# Altium footprint library HW_Dron_V2.PcbLib: 55 footprints (part 1 of 4)
Each footprint in its own frame and in the unit in brackets; x right, y up, seen from the top. Pads: shape width x height; smd on the part's side, far side on the other; paste and mask are expansions set on the pad; w line width, h text height; cw(c..) or ccw(c..) is an arc to the next point about the centre after c.
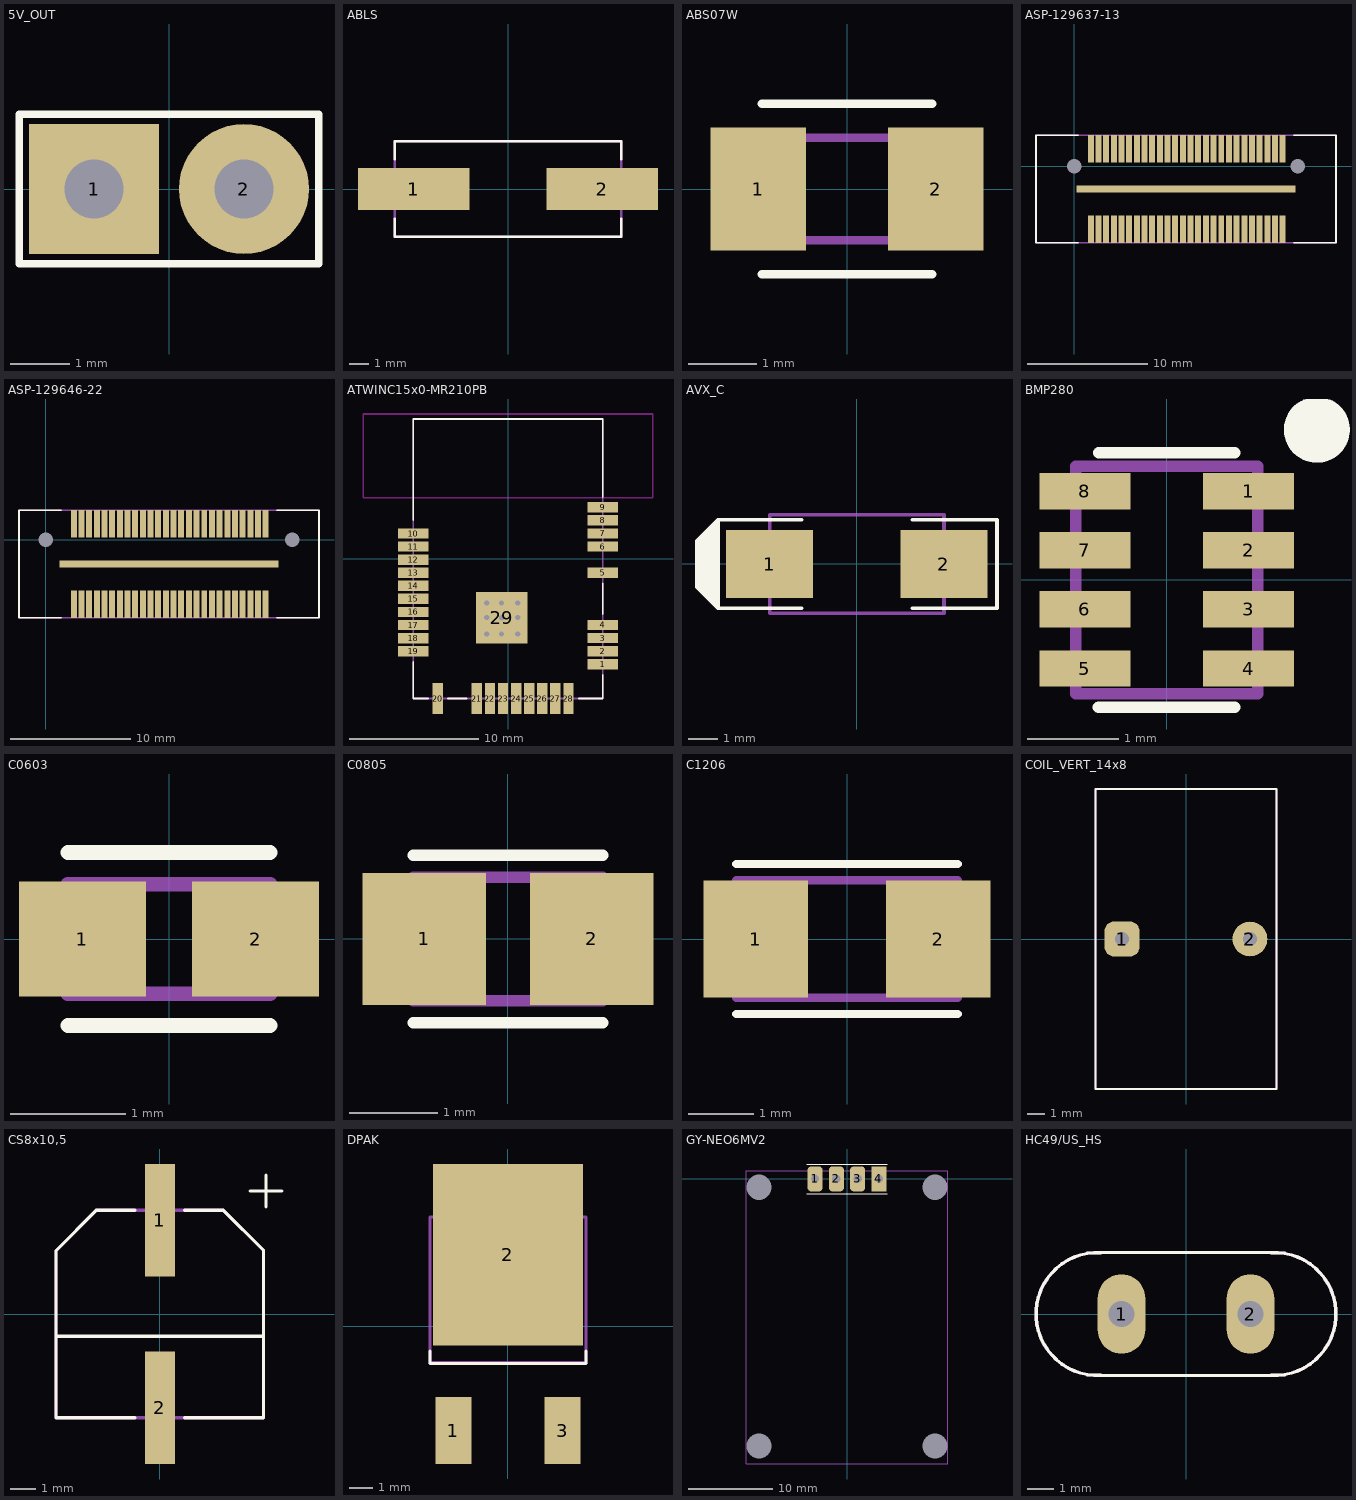
[diagram p0: the footprints below, top view; thin cyan lines are the x and y axes]

## 5V_OUT [mm]
pads (2):
  rect 2.2x2.2 hole 1: 1(-1.27,0)
  round 2.2 hole 1: 2(1.27,0)
Top Overlay:
  lines w0.127: -2.54,-1.27 2.54,-1.27 2.54,1.27 -2.54,1.27 -2.54,-1.27

## ABLS [mm] "XTAL SMD low profile"
height 4.2
pads (2):
  rect 5.6x2.1 smd: 1(-4.75,0) 2(4.75,0)
Top Overlay:
  lines w0.127: -5.7,-1.5 -5.7,-2.4 5.7,-2.4 5.7,-1.5 ; -5.7,1.5 -5.7,2.4 5.7,2.4 5.7,1.5
Mechanical 13:
  lines w0.127: -5.7,-2.4 5.7,-2.4 5.7,2.4 -5.7,2.4 -5.7,-2.4
3D body: height 4.3, standoff 0, extent -6.4,-2.415 6.4,2.415

## ABS07W [mm] "32.768KHZ IoT Optimized SMD Crystal"
height 0.9
pads (2):
  rect 1.4x1.8 smd: 1(-1.3,0) 2(1.3,0)
Top Overlay:
  lines w0.127: -1.25,-1.25 1.25,-1.25 ; -1.25,1.25 1.25,1.25
Mechanical 13:
  lines w0.127: -1.6,-0.75 1.6,-0.75 1.6,0.75 -1.6,0.75 -1.6,-0.75
3D body: height 0.91, standoff 0, extent -1.61,-0.76 1.61,0.76

## ASP-129637-13 [mm] "PCIe/104 OneBank Top Connector"
height 8.7
pads (55):
  rect 0.5x2.3 smd: 1(1.395,-5.275) 2(1.395,1.455) 3(2.035,-5.275) 4(2.035,1.455) 5(2.675,-5.275) 6(2.675,1.455) 7(3.315,-5.275) 8(3.315,1.455) 9(3.955,-5.275) 10(3.955,1.455) 11(4.595,-5.275) 12(4.595,1.455) 13(5.235,-5.275) 14(5.235,1.455) 15(5.875,-5.275) 16(5.875,1.455) 17(6.515,-5.275) 18(6.515,1.455) 19(7.155,-5.275) 20(7.155,1.455) 21(7.795,-5.275) 22(7.795,1.455) 23(8.435,-5.275) 24(8.435,1.455) 25(9.075,-5.275) 26(9.075,1.455) 27(9.715,-5.275) 28(9.715,1.455) 29(10.355,-5.275) 30(10.355,1.455) 31(10.995,-5.275) 32(10.995,1.455) 33(11.635,-5.275) 34(11.635,1.455) 35(12.275,-5.275) 36(12.275,1.455) 37(12.915,-5.275) 38(12.915,1.455) 39(13.555,-5.275) 40(13.555,1.455) 41(14.195,-5.275) 42(14.195,1.455) 43(14.835,-5.275) 44(14.835,1.455) 45(15.475,-5.275) 46(15.475,1.455) 47(16.115,-5.275) 48(16.115,1.455) 49(16.755,-5.275) 50(16.755,1.455) 51(17.395,-5.275) 52(17.395,1.455)
  rect 18.3x0.55 smd: 53(9.335,-1.91)
  rect 0x0 hole 1.2 unplated paste+0 mask+0: ""(0,0) ""(18.67,0)
Top Overlay:
  lines w0.127: 0.335,-6.41 -3.175,-6.41 -3.175,2.59 0.335,2.59 ; 18.335,-6.41 21.845,-6.41 21.845,2.59 18.335,2.59
Mechanical 13:
  lines w0.127: -3.175,-6.41 -3.175,2.59 21.845,2.59 21.845,-6.41 -3.175,-6.41
3D body: height 8.7, standoff 0, extent -3.165,-6.41 21.835,2.59

## ASP-129646-22 [mm] "PCIe/104 OneBank Bottom Connector"
height 9.42
pads (55):
  rect 0.5x2.3 smd: 1(2.345,1.335) 2(2.345,-5.395) 3(2.985,1.335) 4(2.985,-5.395) 5(3.625,1.335) 6(3.625,-5.395) 7(4.265,1.335) 8(4.265,-5.395) 9(4.905,1.335) 10(4.905,-5.395) 11(5.545,1.335) 12(5.545,-5.395) 13(6.185,1.335) 14(6.185,-5.395) 15(6.825,1.335) 16(6.825,-5.395) 17(7.465,1.335) 18(7.465,-5.395) 19(8.105,1.335) 20(8.105,-5.395) 21(8.745,1.335) 22(8.745,-5.395) 23(9.385,1.335) 24(9.385,-5.395) 25(10.025,1.335) 26(10.025,-5.395) 27(10.665,1.335) 28(10.665,-5.395) 29(11.305,1.335) 30(11.305,-5.395) 31(11.945,1.335) 32(11.945,-5.395) 33(12.585,1.335) 34(12.585,-5.395) 35(13.225,1.335) 36(13.225,-5.395) 37(13.865,1.335) 38(13.865,-5.395) 39(14.505,1.335) 40(14.505,-5.395) 41(15.145,1.335) 42(15.145,-5.395) 43(15.785,1.335) 44(15.785,-5.395) 45(16.425,1.335) 46(16.425,-5.395) 47(17.065,1.335) 48(17.065,-5.395) 49(17.705,1.335) 50(17.705,-5.395) 51(18.345,1.335) 52(18.345,-5.395)
  rect 18.3x0.55 smd: 53(10.285,-2.03)
  rect 0x0 hole 1.2 unplated paste+0 mask+0: ""(0,0) ""(20.57,0)
Top Overlay:
  lines w0.127: 1.285,-6.53 -2.225,-6.53 -2.225,2.47 1.285,2.47 ; 19.285,-6.53 22.795,-6.53 22.795,2.47 19.285,2.47
Mechanical 13:
  lines w0.127: -2.225,-6.53 22.795,-6.53 22.795,2.47 -2.225,2.47 -2.225,-6.53
3D body: height 9.42, standoff 0, extent -2.215,-6.53 22.785,2.47

## ATWINC15x0-MR210PB [mm] "802.11 b/g/n SmartConnect  IoT Module"
height 2.113
pads (29):
  rect 2.4x0.8 smd: 1(7.365,-8.19) 2(7.365,-7.174) 3(7.365,-6.158) 4(7.365,-5.142) 5(7.365,-1.078) 6(7.365,0.954) 7(7.365,1.97) 8(7.365,2.986) 9(7.365,4.002) 10(-7.365,1.964) 11(-7.365,0.948) 12(-7.365,-0.068) 13(-7.365,-1.084) 14(-7.365,-2.1) 15(-7.365,-3.116) 16(-7.365,-4.132) 17(-7.365,-5.148) 18(-7.365,-6.164) 19(-7.365,-7.18)
  rect 0.8x2.4 smd: 20(-5.465,-10.86) 21(-2.417,-10.86) 22(-1.401,-10.86) 23(-0.385,-10.86) 24(0.631,-10.86) 25(1.647,-10.86) 26(2.663,-10.86) 27(3.679,-10.86) 28(4.695,-10.86)
  rect 4x4 smd: 29(-0.485,-4.59)
via 0.762,-4.572 diameter 0.711 hole 0.406
via -0.508,-5.842 diameter 0.711 hole 0.406
via 0.762,-5.842 diameter 0.711 hole 0.406
via 0.762,-3.429 diameter 0.711 hole 0.406
via -0.508,-3.429 diameter 0.711 hole 0.406
via -1.651,-3.429 diameter 0.711 hole 0.406
via -1.651,-5.842 diameter 0.711 hole 0.406
via -0.485,-4.59 diameter 0.711 hole 0.406
via -1.651,-4.572 diameter 0.711 hole 0.406
Top Overlay:
  lines w0.127: -7.365,-8 -7.365,-10.86 -6.2,-10.86 ; -7.365,3 -7.365,10.86 7.365,10.86 7.365,4.8 ; -4.66,-10.86 -3.2,-10.86 ; 5.5,-10.86 7.365,-10.86 7.365,-9 ; 7.365,-4.3 7.365,-1.888
Keep-Out Layer:
  lines w0.127: -11.25,4.75 -11.25,11.25 11.25,11.25 11.25,4.75 -11.25,4.75
Mechanical 13:
  lines w0.127: -7.365,-10.86 -7.365,10.86 7.365,10.86 7.365,-10.86 -7.365,-10.86
3D body: height 2.11, standoff 0, extent -7.365,-10.86 7.365,10.86

## AVX_C [mm] "Capacitor AVX Case C"
pads (2):
  rect 3x2.35 smd: 1(-3,0) 2(3,0)
Top Overlay:
  region: -4.776,-1.524 -5.5,-0.8 -5.5,0.8 -4.776,1.524
  lines w0.127: -1.905,-1.524 -4.776,-1.524 ; -1.905,1.524 -4.776,1.524 ; 1.905,-1.524 4.826,-1.524 4.826,1.524 1.905,1.524 ; -4.776,-1.524 -5.5,-0.8 -5.5,0.8 -4.776,1.524 ; -4.776,-1.524 -4.776,1.524
Mechanical 13:
  lines w0.127: -3,-1.7 3,-1.7 3,1.7 -3,1.7 -3,-1.7
3D body: height 2.7, standoff 0, extent -3.05,-1.675 3.05,1.675

## BMP280 [mm] "LGA 2,0*2,5*0,95mm3"
height 0.95
pads (8):
  rect 1x0.4 smd: 1(0.9,0.975) 2(0.9,0.325) 3(0.9,-0.325) 4(0.9,-0.975) 5(-0.9,-0.975) 6(-0.9,-0.325) 7(-0.9,0.325) 8(-0.9,0.975)
Top Overlay:
  circle w0.381: c1.651,1.651 r0.173
  lines w0.127: -0.75,-1.4 0.75,-1.4 ; -0.75,1.4 0.75,1.4
Mechanical 13:
  lines w0.127: -1,-1.25 1,-1.25 1,1.25 -1,1.25 -1,-1.25
3D body: height 1, standoff 0, extent -1,-1.25 1,1.25

## C0603 [mm] "Capacitor SMD 0603"
height 0.85
pads (2):
  rect 1.1x1 smd: 1(-0.75,0) 2(0.75,0)
Top Overlay:
  lines w0.127: -0.875,-0.75 0.875,-0.75 ; -0.875,0.75 0.875,0.75
Mechanical 13:
  lines w0.127: -0.875,-0.475 -0.875,0.475 0.875,0.475 0.875,-0.475 -0.875,-0.475
3D body: height 0.83, standoff -0.03, extent -0.8,-0.43 0.8,0.43

## C0805 [mm] "Capacitor SMD 0805"
height 1.1
pads (2):
  rect 1.4x1.5 smd: 1(-0.95,0) 2(0.95,0)
Top Overlay:
  lines w0.127: -1.075,-0.95 1.075,-0.95 ; -1.075,0.95 1.075,0.95
Mechanical 13:
  lines w0.127: -1.075,0.7 -1.075,-0.7 1.075,-0.7 1.075,0.7 -1.075,0.7
3D body: height 0.8, standoff 0, extent -1,-0.625 1,0.625

## C1206 [mm] "Capacitor SMD 1206"
height 1.35
pads (2):
  rect 1.6x1.8 smd: 1(-1.4,0) 2(1.4,0)
Top Overlay:
  lines w0.127: -1.7,-1.15 1.7,-1.15 ; -1.7,1.15 1.7,1.15
Mechanical 13:
  lines w0.127: -1.7,-0.9 1.7,-0.9 1.7,0.9 -1.7,0.9 -1.7,-0.9
3D body: height 1.53, standoff -0.03, extent -1.6,-0.83 1.6,0.83

## COIL_VERT_14x8 [mm] "Toroide vertical de 14x8"
height 17.272
pads (2):
  rrect50% 2x2 hole 0.8: 1(-3.683,0)
  round 2 hole 0.8: 2(3.683,0)
Top Overlay:
  lines w0.127: -5.207,-8.636 5.207,-8.636 5.207,8.636 -5.207,8.636 -5.207,-8.636
Mechanical 13:
  lines w0.127: -5.207,-8.636 5.207,-8.636 5.207,8.636 -5.207,8.636 -5.207,-8.636
3D body: height 13.84, standoff -2.86, extent -5.135,-7.337 4.363,6.337

## CS8x10,5 [mm]
pads (2):
  rect 1.2x4.5 smd: 1(0,3.75) 2(0,-3.75)
Top Overlay:
  lines w0.127: -4.15,-0.889 4.15,-0.889 ; -1,-4.15 -4.15,-4.15 -4.15,2.54 -2.54,4.15 -1,4.15 ; 1,-4.15 4.15,-4.15 4.15,2.54 2.54,4.15 1,4.15 ; 3.615,4.915 4.885,4.915 ; 4.25,4.28 4.25,5.55
Mechanical 13:
  lines w0.127: -4.15,-4.15 -4.15,2.54 -2.54,4.15 2.54,4.15 4.15,2.54 4.15,-4.15 -4.15,-4.15
3D body: height 10.55, standoff 0.05, extent -4.25,-4.801 4.25,4.899

## DPAK [mm] "TO-252"
pads (3):
  rect 1.5x2.8 smd: 1(-2.286,-4.365) 3(2.286,-4.365)
  rect 6.3x7.6 smd: 2(0,3)
Top Overlay:
  lines w0.127: -3.27,-1.025 -3.27,-1.55 3.27,-1.55 3.27,-1.025
Mechanical 13:
  lines w0.127: -3.27,-1.524 3.27,-1.524 3.27,4.571 -3.27,4.571 -3.27,-1.524
3D body: height 2.4, standoff 0, extent -3.367,-4.701 3.367,5.399

## GY-NEO6MV2 [mm] "Modulo GPS NEO6MV2"
pads (8):
  rrect50% 1.8x3 hole 1: 1(-3.81,0) 2(-1.27,0) 3(1.27,0)
  rect 1.8x3 hole 1: 4(3.81,0)
  round 1.25 hole 3 unplated: ""(-10.5,-31.86) ""(-10.5,-1) ""(10.5,-31.86) ""(10.5,-1)
Top Overlay:
  lines w0.127: -4.826,-1.778 4.826,-1.778 ; -4.826,1.778 4.826,1.778
Mechanical 13:
  lines w0.127: -12,-34 -12,1 12,1 12,-34 -12,-34
3D body: height 14.12, standoff 1.7, extent -12.75,-38.813 12.75,1.5
3D body: height 5.94, standoff -2.94, extent -5.08,-1.27 5.08,1.27

## HC49/US_HS [mm]
pads (2):
  oval 1.8x3 hole 1: 1(-2.44,0) 2(2.44,0)
Top Overlay:
  lines w0.127: -3.35,-2.325 3.35,-2.325 ; -3.35,2.325 3.35,2.325 ; -3.219,-2.321 cw(c-3.35,0) -3.219,2.321 ; 3.219,-2.321 ccw(c3.35,0) 3.219,2.321
Mechanical 13:
  lines w0.127: -3.35,-2.325 3.35,-2.325 ; -3.35,2.325 3.35,2.325 ; -3.219,-2.321 cw(c-3.35,0) -3.219,2.321 ; 3.219,-2.321 ccw(c3.35,0) 3.219,2.321
3D body: height 3.5, standoff -3, extent -5.4,-2.25 5.4,2.25